# Altium integrated library GPDSE.IntLib: 634 symbols (part 4 of 7)
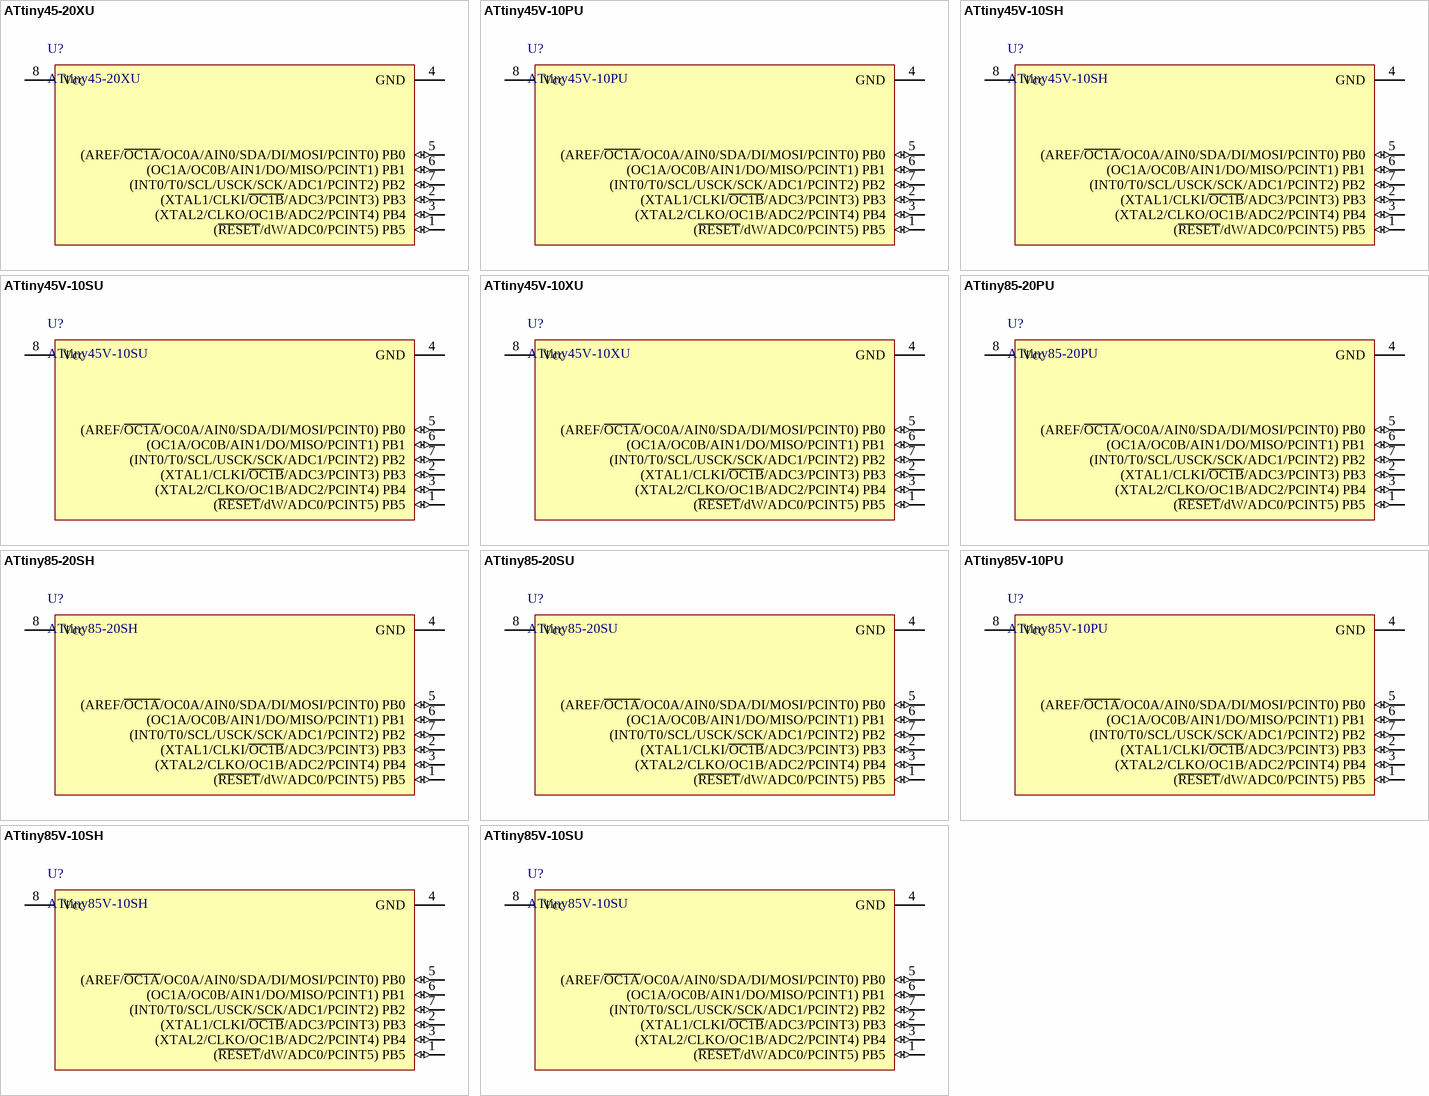
[diagram p38: symbols ATtiny45-20XU to ATtiny85V-10SU]

## ATtiny85-20SH
designator U?
Atmel 8-bit AVR Microcontroller with 8 KB In-System Programmable Flash; ADC Channel: 4; Clock Frequency: 0 - 20 MHz; Debug: debugWire; EEPROM Memory: 512 B; Flash Memory: 8 KB; I/O Pins: 6; PWM Channel: 2; Serial USI: 1; Supply Voltage (Vdd): 2.7 - 5.5 V; Analog Comparator: *; SRAM Memory: 512 B; Timer 8 bits: 1
footprint SOP08-5.3mm(1.27mm) (Small Outline Package 8 pin)
pins: 1 (~{RESET}/dW/ADC0/PCINT5) PB5 (io), 2 (XTAL1/CLKI/~{OC1B}/ADC3/PCINT3) PB3 (io), 3 (XTAL2/CLKO/OC1B/ADC2/PCINT4) PB4 (io), 4 GND (power), 5 (AREF/~{OC1A}/OC0A/AIN0/SDA/DI/MOSI/PCINT0) PB0 (io), 6 (OC1A/OC0B/AIN1/DO/MISO/PCINT1) PB1 (io), 7 (INT0/T0/SCL/USCK/SCK/ADC1/PCINT2) PB2 (io), 8 Vcc (power)

## ATtiny85-20SU
designator U?
Atmel 8-bit AVR Microcontroller with 8 KB In-System Programmable Flash; ADC Channel: 4; Clock Frequency: 0 - 20 MHz; Debug: debugWire; EEPROM Memory: 512 B; Flash Memory: 8 KB; I/O Pins: 6; PWM Channel: 2; Serial USI: 1; Supply Voltage (Vdd): 2.7 - 5.5 V; Analog Comparator: *; SRAM Memory: 512 B; Timer 8 bits: 1
footprint SOP08-5.3mm(1.27mm) (Small Outline Package 8 pin)
pins: 1 (~{RESET}/dW/ADC0/PCINT5) PB5 (io), 2 (XTAL1/CLKI/~{OC1B}/ADC3/PCINT3) PB3 (io), 3 (XTAL2/CLKO/OC1B/ADC2/PCINT4) PB4 (io), 4 GND (power), 5 (AREF/~{OC1A}/OC0A/AIN0/SDA/DI/MOSI/PCINT0) PB0 (io), 6 (OC1A/OC0B/AIN1/DO/MISO/PCINT1) PB1 (io), 7 (INT0/T0/SCL/USCK/SCK/ADC1/PCINT2) PB2 (io), 8 Vcc (power)

## ATtiny85V-10PU
designator U?
Atmel 8-bit AVR Microcontroller with 8 KB In-System Programmable Flash; ADC Channel: 4; Clock Frequency: 0 - 10 MHz; Debug: debugWire; EEPROM Memory: 512 B; Flash Memory: 8 KB; I/O Pins: 6; PWM Channel: 2; Serial USI: 1; Supply Voltage (Vdd): 1.8 - 5.5 V; Analog Comparator: *; SRAM Memory: 512 B; Timer 8 bits: 1
footprint DIP08-300(100) (DIP; 8 Leads; Row Spacing 7.62 mm; Pitch 2.54 mm; 3D CircuitWorks)
pins: 1 (~{RESET}/dW/ADC0/PCINT5) PB5 (io), 2 (XTAL1/CLKI/~{OC1B}/ADC3/PCINT3) PB3 (io), 3 (XTAL2/CLKO/OC1B/ADC2/PCINT4) PB4 (io), 4 GND (power), 5 (AREF/~{OC1A}/OC0A/AIN0/SDA/DI/MOSI/PCINT0) PB0 (io), 6 (OC1A/OC0B/AIN1/DO/MISO/PCINT1) PB1 (io), 7 (INT0/T0/SCL/USCK/SCK/ADC1/PCINT2) PB2 (io), 8 Vcc (power)

## ATtiny85V-10SH
designator U?
Atmel 8-bit AVR Microcontroller with 8 KB In-System Programmable Flash; ADC Channel: 4; Clock Frequency: 0 - 10 MHz; Debug: debugWire; EEPROM Memory: 512 B; Flash Memory: 8 KB; I/O Pins: 6; PWM Channel: 2; Serial USI: 1; Supply Voltage (Vdd): 1.8 - 5.5 V; Analog Comparator: *; SRAM Memory: 512 B; Timer 8 bits: 1
footprint SOP08-5.3mm(1.27mm) (Small Outline Package 8 pin)
pins: 1 (~{RESET}/dW/ADC0/PCINT5) PB5 (io), 2 (XTAL1/CLKI/~{OC1B}/ADC3/PCINT3) PB3 (io), 3 (XTAL2/CLKO/OC1B/ADC2/PCINT4) PB4 (io), 4 GND (power), 5 (AREF/~{OC1A}/OC0A/AIN0/SDA/DI/MOSI/PCINT0) PB0 (io), 6 (OC1A/OC0B/AIN1/DO/MISO/PCINT1) PB1 (io), 7 (INT0/T0/SCL/USCK/SCK/ADC1/PCINT2) PB2 (io), 8 Vcc (power)

## ATtiny85V-10SU
designator U?
Atmel 8-bit AVR Microcontroller with 8 KB In-System Programmable Flash; ADC Channel: 4; Clock Frequency: 0 - 10 MHz; Debug: debugWire; EEPROM Memory: 512 B; Flash Memory: 8 KB; I/O Pins: 6; PWM Channel: 2; Serial USI: 1; Supply Voltage (Vdd): 1.8 - 5.5 V; Analog Comparator: *; SRAM Memory: 512 B; Timer 8 bits: 1
footprint SOP08-5.3mm(1.27mm) (Small Outline Package 8 pin)
pins: 1 (~{RESET}/dW/ADC0/PCINT5) PB5 (io), 2 (XTAL1/CLKI/~{OC1B}/ADC3/PCINT3) PB3 (io), 3 (XTAL2/CLKO/OC1B/ADC2/PCINT4) PB4 (io), 4 GND (power), 5 (AREF/~{OC1A}/OC0A/AIN0/SDA/DI/MOSI/PCINT0) PB0 (io), 6 (OC1A/OC0B/AIN1/DO/MISO/PCINT1) PB1 (io), 7 (INT0/T0/SCL/USCK/SCK/ADC1/PCINT2) PB2 (io), 8 Vcc (power)


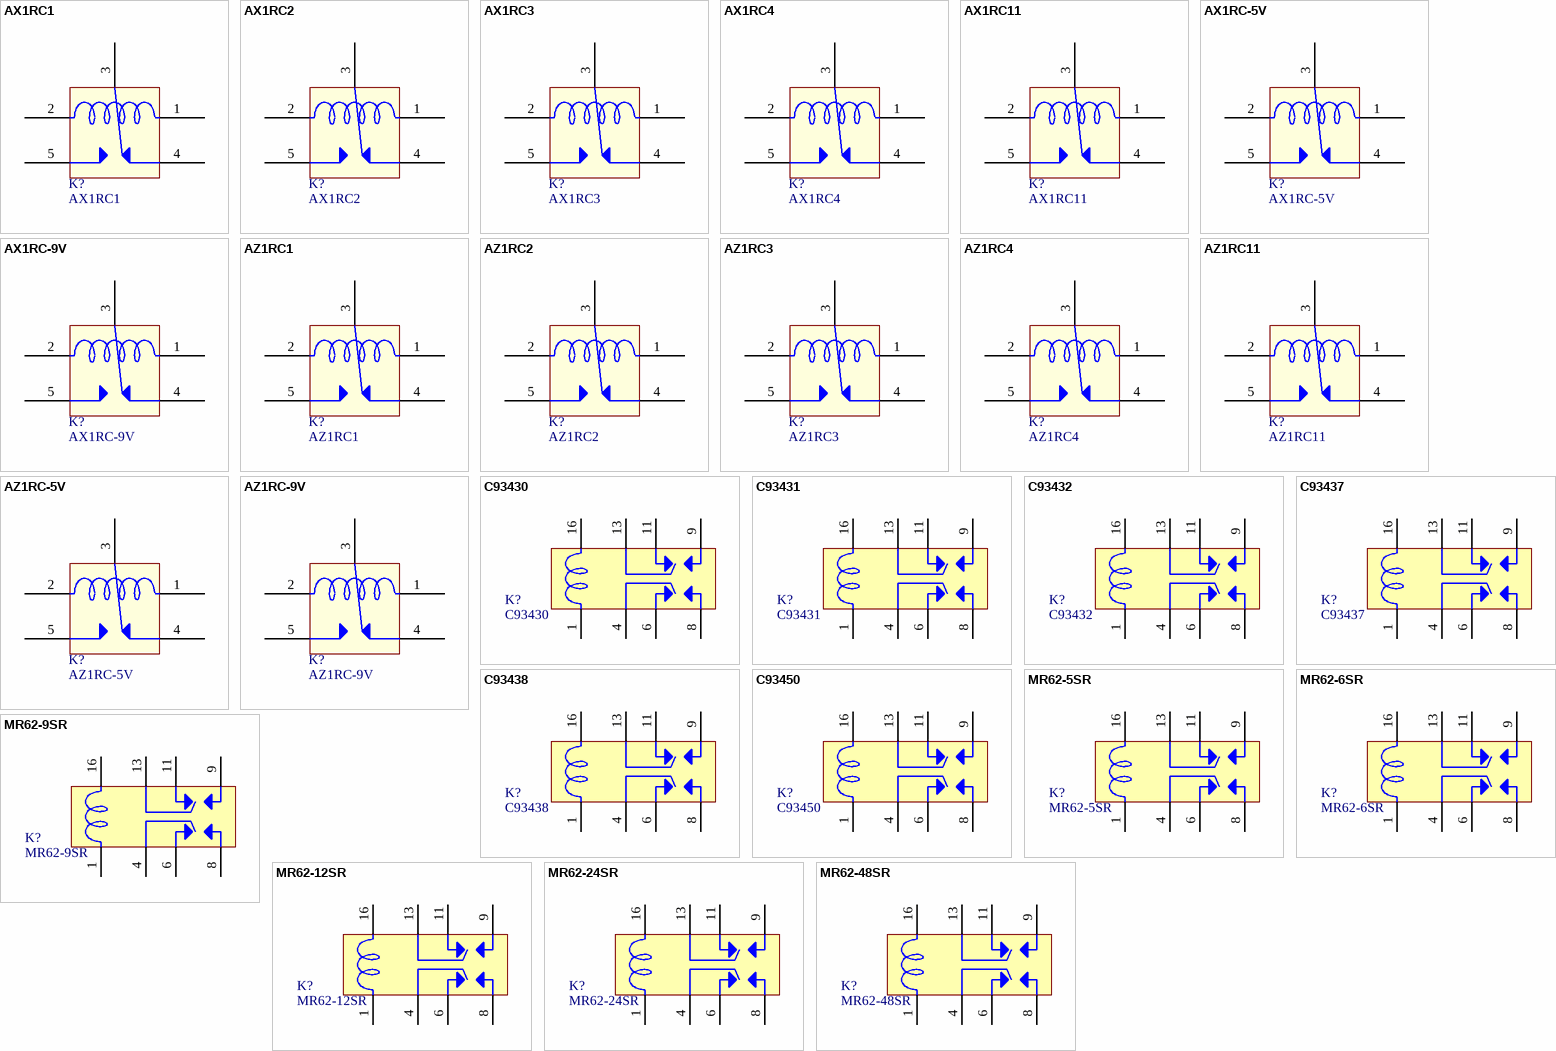
[diagram p18: symbols AX1RC1 to MR62-48SR]

## AX1RC1
designator K?
Miniature Relay, 15 A, 6 Vdc, 250 Vac; Maximum Switching Voltage (AC): 250 V; Maximum Switching Voltage (DC): 110 V; Maximum Switching Current: 15 A; Coil Nominal Voltage (DC): 6 V
footprint Relay-A (Metaltex Relay Type A; 3D: Jean-François Garneau)
pins: 1, 2, 3, 4, 5

## AX1RC2
designator K?
Miniature Relay, 15 A, 12 Vdc, 250 Vac; Maximum Switching Voltage (AC): 250 V; Maximum Switching Voltage (DC): 110 V; Maximum Switching Current: 15 A; Coil Nominal Voltage (DC): 12 V
footprint Relay-A (Metaltex Relay Type A; 3D: Jean-François Garneau)
pins: 1, 2, 3, 4, 5

## AX1RC3
designator K?
Miniature Relay, 15 A, 24 Vdc, 250 Vac; Maximum Switching Voltage (AC): 250 V; Maximum Switching Voltage (DC): 110 V; Maximum Switching Current: 15 A; Coil Nominal Voltage (DC): 24 V
footprint Relay-A (Metaltex Relay Type A; 3D: Jean-François Garneau)
pins: 1, 2, 3, 4, 5

## AX1RC4
designator K?
Miniature Relay, 15 A, 48 Vdc, 250 Vac; Maximum Switching Voltage (AC): 250 V; Maximum Switching Voltage (DC): 110 V; Maximum Switching Current: 15 A; Coil Nominal Voltage (DC): 48 V
footprint Relay-A (Metaltex Relay Type A; 3D: Jean-François Garneau)
pins: 1, 2, 3, 4, 5

## AX1RC11
designator K?
Miniature Relay, 15 A, 3 Vdc, 250 Vac; Maximum Switching Voltage (AC): 250 V; Maximum Switching Voltage (DC): 110 V; Maximum Switching Current: 15 A; Coil Nominal Voltage (DC): 3 V
footprint Relay-A (Metaltex Relay Type A; 3D: Jean-François Garneau)
pins: 1, 2, 3, 4, 5

## AX1RC-5V
designator K?
Miniature Relay, 15 A, 5 Vdc, 250 Vac; Maximum Switching Voltage (AC): 250 V; Maximum Switching Voltage (DC): 110 V; Maximum Switching Current: 15 A; Coil Nominal Voltage (DC): 5 V
footprint Relay-A (Metaltex Relay Type A; 3D: Jean-François Garneau)
pins: 1, 2, 3, 4, 5

## AX1RC-9V
designator K?
Miniature Relay, 15 A, 9 Vdc, 250 Vac; Maximum Switching Voltage (AC): 250 V; Maximum Switching Voltage (DC): 110 V; Maximum Switching Current: 15 A; Coil Nominal Voltage (DC): 9 V
footprint Relay-A (Metaltex Relay Type A; 3D: Jean-François Garneau)
pins: 1, 2, 3, 4, 5

## AZ1RC1
designator K?
Miniature Relay, 10 A, 6 Vdc, 250 Vac; Maximum Switching Voltage (AC): 250 V; Maximum Switching Voltage (DC): 30 V; Maximum Switching Current: 10 A; Coil Nominal Voltage (DC): 6 V
footprint Relay-A (Metaltex Relay Type A; 3D: Jean-François Garneau)
pins: 1, 2, 3, 4, 5

## AZ1RC2
designator K?
Miniature Relay, 10 A, 12 Vdc, 250 Vac; Maximum Switching Voltage (AC): 250 V; Maximum Switching Voltage (DC): 30 V; Maximum Switching Current: 10 A; Coil Nominal Voltage (DC): 12 V
footprint Relay-A (Metaltex Relay Type A; 3D: Jean-François Garneau)
pins: 1, 2, 3, 4, 5

## AZ1RC3
designator K?
Miniature Relay, 10 A, 24 Vdc, 250 Vac; Maximum Switching Voltage (AC): 250 V; Maximum Switching Voltage (DC): 30 V; Maximum Switching Current: 10 A; Coil Nominal Voltage (DC): 24 V
footprint Relay-A (Metaltex Relay Type A; 3D: Jean-François Garneau)
pins: 1, 2, 3, 4, 5

## AZ1RC4
designator K?
Miniature Relay, 10 A, 48 Vdc, 250 Vac; Maximum Switching Voltage (AC): 250 V; Maximum Switching Voltage (DC): 30 V; Maximum Switching Current: 10 A; Coil Nominal Voltage (DC): 48 V
footprint Relay-A (Metaltex Relay Type A; 3D: Jean-François Garneau)
pins: 1, 2, 3, 4, 5

## AZ1RC11
designator K?
Miniature Relay, 10 A, 3 Vdc, 250 Vac; Maximum Switching Voltage (AC): 250 V; Maximum Switching Voltage (DC): 30 V; Maximum Switching Current: 10 A; Coil Nominal Voltage (DC): 3 V
footprint Relay-A (Metaltex Relay Type A; 3D: Jean-François Garneau)
pins: 1, 2, 3, 4, 5

## AZ1RC-5V
designator K?
Miniature Relay, 10 A, 5 Vdc, 250 Vac; Maximum Switching Voltage (AC): 250 V; Maximum Switching Voltage (DC): 30 V; Maximum Switching Current: 10 A; Coil Nominal Voltage (DC): 5 V
footprint Relay-A (Metaltex Relay Type A; 3D: Jean-François Garneau)
pins: 1, 2, 3, 4, 5

## AZ1RC-9V
designator K?
Miniature Relay, 10 A, 9 Vdc, 250 Vac; Maximum Switching Voltage (AC): 250 V; Maximum Switching Voltage (DC): 30 V; Maximum Switching Current: 10 A; Coil Nominal Voltage (DC): 9 V
footprint Relay-A (Metaltex Relay Type A; 3D: Jean-François Garneau)
pins: 1, 2, 3, 4, 5

## C93430
designator K?
Signal Relay, 2 A, 48 Vdc, 250 Vac; Maximum Switching Voltage (AC): 250 V; Maximum Switching Voltage (DC): 220 V; Maximum Switching Current: 2 A; Coil Nominal Voltage (DC): 48 V
footprint RELAY-ML (Metaltex Relay Type ML; 3D: Andrea Gramazio)
pins: 1 Coil1, 4 C1, 6 NC1, 8 NO1, 9 NO2, 11 NC2, 13 C2, 16 Coil2

## C93431
designator K?
Signal Relay, 2 A, 24 Vdc, 250 Vac; Maximum Switching Voltage (AC): 250 V; Maximum Switching Voltage (DC): 220 V; Maximum Switching Current: 2 A; Coil Nominal Voltage (DC): 24 V
footprint RELAY-ML (Metaltex Relay Type ML; 3D: Andrea Gramazio)
pins: 1 Coil1, 4 C1, 6 NC1, 8 NO1, 9 NO2, 11 NC2, 13 C2, 16 Coil2

## C93432
designator K?
Signal Relay, 2 A, 12 Vdc, 250 Vac; Maximum Switching Voltage (AC): 250 V; Maximum Switching Voltage (DC): 220 V; Maximum Switching Current: 2 A; Coil Nominal Voltage (DC): 12 V
footprint RELAY-ML (Metaltex Relay Type ML; 3D: Andrea Gramazio)
pins: 1 Coil1, 4 C1, 6 NC1, 8 NO1, 9 NO2, 11 NC2, 13 C2, 16 Coil2

## C93437
designator K?
Signal Relay, 2 A, 6 Vdc, 250 Vac; Maximum Switching Voltage (AC): 250 V; Maximum Switching Voltage (DC): 220 V; Maximum Switching Current: 2 A; Coil Nominal Voltage (DC): 6 V
footprint RELAY-ML (Metaltex Relay Type ML; 3D: Andrea Gramazio)
pins: 1 Coil1, 4 C1, 6 NC1, 8 NO1, 9 NO2, 11 NC2, 13 C2, 16 Coil2

## C93438
designator K?
Signal Relay, 2 A, 4.5 Vdc, 250 Vac; Maximum Switching Voltage (AC): 250 V; Maximum Switching Voltage (DC): 220 V; Maximum Switching Current: 2 A; Coil Nominal Voltage (DC): 4.5 V
footprint RELAY-ML (Metaltex Relay Type ML; 3D: Andrea Gramazio)
pins: 1 Coil1, 4 C1, 6 NC1, 8 NO1, 9 NO2, 11 NC2, 13 C2, 16 Coil2

## C93450
designator K?
Signal Relay, 2 A, 5 Vdc, 250 Vac; Maximum Switching Voltage (AC): 250 V; Maximum Switching Voltage (DC): 220 V; Maximum Switching Current: 2 A; Coil Nominal Voltage (DC): 5 V
footprint RELAY-ML (Metaltex Relay Type ML; 3D: Andrea Gramazio)
pins: 1 Coil1, 4 C1, 6 NC1, 8 NO1, 9 NO2, 11 NC2, 13 C2, 16 Coil2

## MR62-5SR
designator K?
Miniature Signal Relay, 2 A, 5 Vdc, 250 Vac; Maximum Switching Voltage (AC): 250 V; Maximum Switching Voltage (DC): 220 V; Maximum Switching Current: 2 A; Coil Nominal Voltage (DC): 5 V
footprint RELAY-ML (Metaltex Relay Type ML; 3D: Andrea Gramazio)
pins: 1 Coil1, 4 C1, 6 NC1, 8 NO1, 9 NO2, 11 NC2, 13 C2, 16 Coil2

## MR62-6SR
designator K?
Miniature Signal Relay, 2 A, 6 Vdc, 250 Vac; Maximum Switching Voltage (AC): 250 V; Maximum Switching Voltage (DC): 220 V; Maximum Switching Current: 2 A; Coil Nominal Voltage (DC): 6 V
footprint RELAY-ML (Metaltex Relay Type ML; 3D: Andrea Gramazio)
pins: 1 Coil1, 4 C1, 6 NC1, 8 NO1, 9 NO2, 11 NC2, 13 C2, 16 Coil2

## MR62-9SR
designator K?
Miniature Signal Relay, 2 A, 9 Vdc, 250 Vac; Maximum Switching Voltage (AC): 250 V; Maximum Switching Voltage (DC): 220 V; Maximum Switching Current: 2 A; Coil Nominal Voltage (DC): 9 V
footprint RELAY-ML (Metaltex Relay Type ML; 3D: Andrea Gramazio)
pins: 1 Coil1, 4 C1, 6 NC1, 8 NO1, 9 NO2, 11 NC2, 13 C2, 16 Coil2

## MR62-12SR
designator K?
Miniature Signal Relay, 2 A, 12 Vdc, 250 Vac; Maximum Switching Voltage (AC): 250 V; Maximum Switching Voltage (DC): 220 V; Maximum Switching Current: 2 A; Coil Nominal Voltage (DC): 12 V
footprint RELAY-ML (Metaltex Relay Type ML; 3D: Andrea Gramazio)
pins: 1 Coil1, 4 C1, 6 NC1, 8 NO1, 9 NO2, 11 NC2, 13 C2, 16 Coil2

## MR62-24SR
designator K?
Miniature Signal Relay, 2 A, 24 Vdc, 250 Vac; Maximum Switching Voltage (AC): 250 V; Maximum Switching Voltage (DC): 220 V; Maximum Switching Current: 2 A; Coil Nominal Voltage (DC): 24 V
footprint RELAY-ML (Metaltex Relay Type ML; 3D: Andrea Gramazio)
pins: 1 Coil1, 4 C1, 6 NC1, 8 NO1, 9 NO2, 11 NC2, 13 C2, 16 Coil2

## MR62-48SR
designator K?
Miniature Signal Relay, 2 A, 48 Vdc, 250 Vac; Maximum Switching Voltage (AC): 250 V; Maximum Switching Voltage (DC): 220 V; Maximum Switching Current: 2 A; Coil Nominal Voltage (DC): 48 V
footprint RELAY-ML (Metaltex Relay Type ML; 3D: Andrea Gramazio)
pins: 1 Coil1, 4 C1, 6 NC1, 8 NO1, 9 NO2, 11 NC2, 13 C2, 16 Coil2


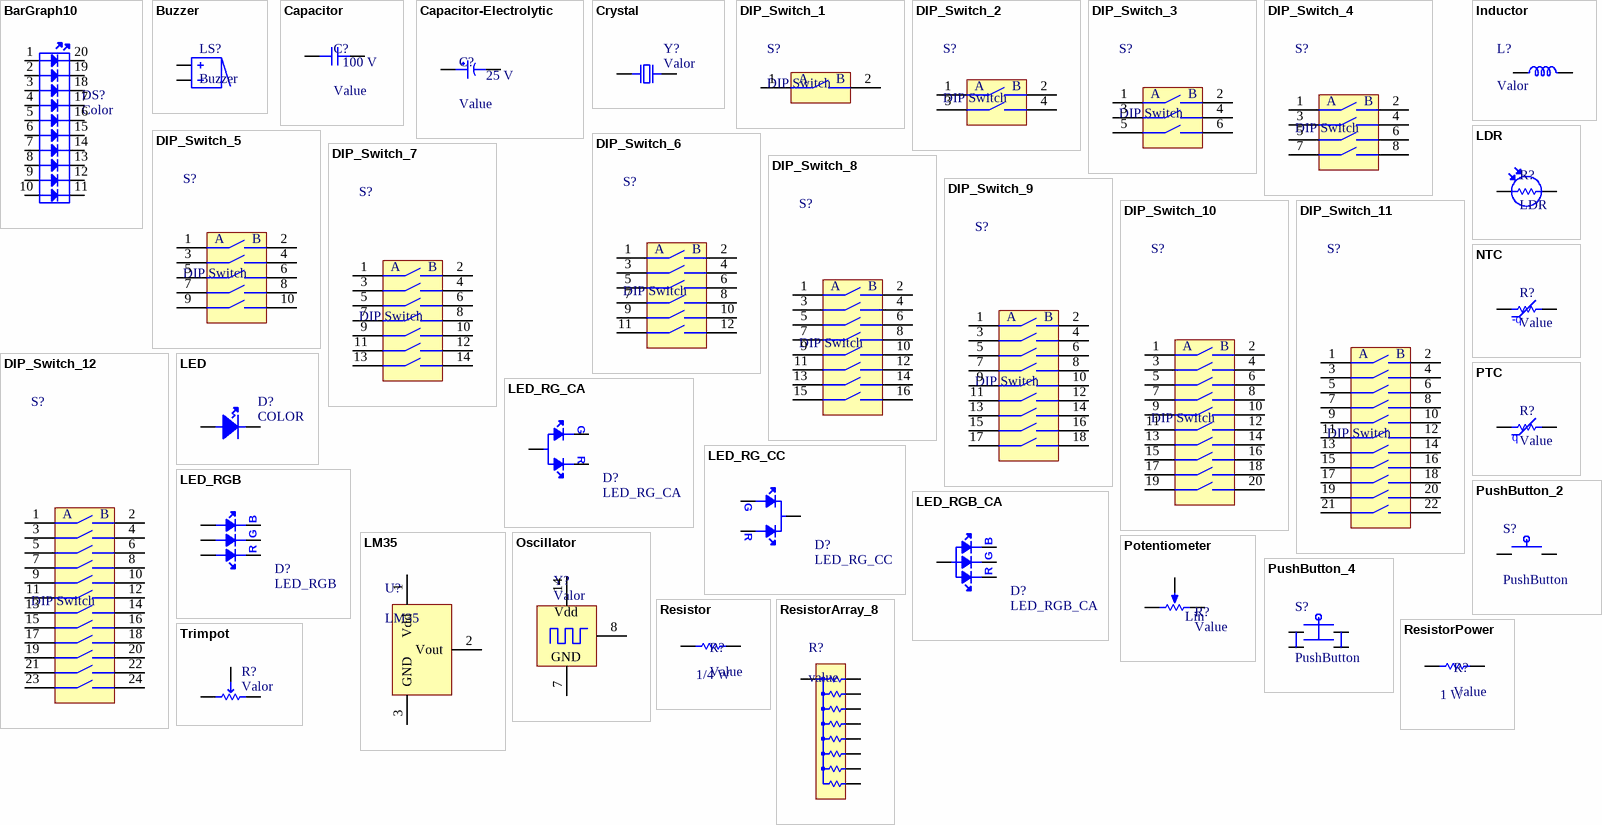
[diagram p19: symbols BarGraph10 to Trimpot]

## BarGraph10
designator DS?, comment Color
10 Segments - Bar Graph
footprint B210G (10 Segments Bar Graph - Yellow Green)
footprint B210O (10 Segments Bar Graph - Red Orange)
footprint B210SR (10 Segments Bar Graph - Ultra Bright Red)
footprint B210B-14BL (10 Segments Bar Graph - Ultra Bright Blue)
pins: 1 A1, 2 A2, 3 A3, 4 A4, 5 A5, 6 A6, 7 A7, 8 A8, 9 A9, 10 A10, 11 K10, 12 K9, 13 K8, 14 K7, 15 K6, 16 K5, 17 K4, 18 K3, 19 K2, 20 K1

## Buzzer
designator LS?
footprint Buzzer-12.0mm-6.5mm (Buzzer circular 12.0mm diameter 6.5mm pitch)
pins: 1 -, 2 +

## Capacitor
designator C?, comment Value  Voltage: 100 V
Capacitor; Published: 8-Jun-2000; LatestRevisionDate: 17-Jul-2002; LatestRevisionNote: Re-released for DXP Platform.; PackageReference: RAD-0.3; Publisher: Altium Limited
footprint C100-200-100 (Radial Cap, Thru-Hole; 2 Leads; 0.1 in Pin Spacing)
footprint C200-350-150 (Radial Cap, Thru-Hole; 2 Leads; 0.2 in Pin Spacing)
footprint C300-450-150 (Radial Cap, Thru-Hole; 2 Leads; 0.3 in Pin Spacing)
footprint C400-550-150 (Radial Cap, Thru-Hole; 2 Leads; 0.4 in Pin Spacing)
footprint 0805C (Chip Capacitor; Body 2 x 1.3 mm (LxW typ))
pins: 1, 2

## Capacitor-Electrolytic
designator C?, comment Value  Voltage: 25 V
Electrolytic Capacitor
footprint CP-RAD-4.0mm-7.0mm-1.5mm (Radial Capacitor; D 4.0mm; L 7.0mm; P 1.5mm)
footprint CP-RAD-4.0mm-11.0mm-1.5mm (Radial Capacitor; D 4.0mm; L 11.0mm; P 1.5mm)
footprint CP-RAD-5.0mm-7.0mm-2.0mm (Radial Capacitor; D 5.0mm; L 7.0mm; P 2.0mm)
footprint CP-RAD-5.0mm-11.0mm-2.0mm (Radial Capacitor; D 5.0mm; L 11.0mm; P 2.0mm)
footprint CP-RAD-5.0mm-15.0mm-2.0mm (Radial Capacitor; D 5.0mm; L 15.0mm; P 2.0mm)
footprint CP-RAD-6.3mm-7.0mm-2.5mm (Radial Capacitor; D 6.3mm; L 7.0mm; P 2.5mm)
footprint CP-RAD-6.3mm-11.2mm-2.5mm (Radial Capacitor; D 6.3mm; L 11.2mm; P 2.5mm)
footprint CP-RAD-6.3mm-15.0mm-2.5mm (Radial Capacitor; D 6.3mm; L 15.0mm; P 2.5mm)
footprint CP-RAD-8.0mm-11.5mm-3.5mm (Radial Capacitor; D 8.0mm; L 11.5mm; P 3.5mm)
footprint CP-RAD-8.0mm-15.0mm-3.5mm (Radial Capacitor; D 8.0mm; L 15.0mm; P 3.5mm)
footprint CP-RAD-8.0mm-20.0mm-3.5mm (Radial Capacitor; D 8.0mm; L 20.0mm; P 3.5mm)
footprint CP-RAD-10.0mm-12.5mm-5.0mm (Radial Capacitor; D 10.0mm; L 12.5mm; P 5.0mm)
footprint CP-RAD-10.0mm-16.0mm-5.0mm (Radial Capacitor; D 10.0mm; L 16.0mm; P 5.0mm)
footprint CP-RAD-10.0mm-20.0mm-5.0mm (Radial Capacitor; D 10.0mm; L 20.0mm; P 5.0mm)
footprint CP-RAD-10.0mm-25.0mm-5.0mm (Radial Capacitor; D 10.0mm; L 25.0mm; P 5.0mm)
footprint CP-RAD-10.0mm-30.0mm-5.0mm (Radial Capacitor; D 10.0mm; L 30.0mm; P 5.0mm)
footprint CP-RAD-12.5mm-15.0mm-5.0mm (Radial Capacitor; D 12.5mm; L 15.0mm; P 5.0mm)
footprint CP-RAD-12.5mm-20.0mm-5.0mm (Radial Capacitor; D 12.5mm; L 20.0mm; P 5.0mm)
footprint CP-RAD-12.5mm-25.0mm-5.0mm (Radial Capacitor; D 12.5mm; L 25.0mm; P 5.0mm)
footprint CP-RAD-12.5mm-30.0mm-5.0mm (Radial Capacitor; D 12.5mm; L 30.0mm; P 5.0mm)
footprint CP-RAD-12.5mm-40.0mm-5.0mm (Radial Capacitor; D 12.5mm; L 40.0mm; P 5.0mm)
footprint CP-RAD-16.0mm-15.0mm-7.5mm (Radial Capacitor; D 16.0mm; L 15.0mm; P 7.5mm)
footprint CP-RAD-16.0mm-20.0mm-7.5mm (Radial Capacitor; D 16.0mm; L 20.0mm; P 7.5mm)
footprint CP-RAD-16.0mm-25.0mm-7.5mm (Radial Capacitor; D 16.0mm; L 25.0mm; P 7.5mm)
footprint CP-RAD-16.0mm-31.5mm-7.5mm (Radial Capacitor; D 16.0mm; L 31.5mm; P 7.5mm)
footprint CP-RAD-16.0mm-35.5mm-7.5mm (Radial Capacitor; D 16.0mm; L 35.5mm; P 7.5mm)
footprint CP-RAD-16.0mm-40.0mm-7.5mm (Radial Capacitor; D 16.0mm; L 40.0mm; P 7.5mm)
footprint CP-RAD-18.0mm-15.0mm-7.5mm (Radial Capacitor; D 18.0mm; L 15.0mm; P 7.5mm)
footprint CP-RAD-18.0mm-20.0mm-7.5mm (Radial Capacitor; D 18.0mm; L 20.0mm; P 7.5mm)
footprint CP-RAD-18.0mm-25.0mm-7.5mm (Radial Capacitor; D 18.0mm; L 25.0mm; P 7.5mm)
footprint CP-RAD-18.0mm-31.5mm-7.5mm (Radial Capacitor; D 18.0mm; L 31.5mm; P 7.5mm)
footprint CP-RAD-18.0mm-35.5mm-7.5mm (Radial Capacitor; D 18.0mm; L 35.5mm; P 7.5mm)
footprint CP-RAD-18.0mm-40.0mm-7.5mm (Radial Capacitor; D 18.0mm; L 40.0mm; P 7.5mm)
footprint CP-RAD-12.5mm-35.0mm-5.0mm (Radial Capacitor; D 12.5mm; L 35.0mm; P 5.0mm)
footprint CP-SMD(B)-4.3mm-4.3mm-5.4mm (Electrolytic Capacitor SMD Radial Can; C Type; W 4.3mm; L 4.3mm; H 5.4mm)
footprint CP-SMD(C)-5.3mm-5.3mm-5.8mm (Electrolytic Capacitor SMD Radial Can; C Type; W 5.3mm; L 5.3mm; H 5.8mm)
footprint CP-SMD(D)-6.6mm-6.6mm-5.8mm (Electrolytic Capacitor SMD Radial Can; D Type; W 6.6mm; L 6.6mm; H 5.8mm)
footprint CP-SMD(D8)-6.6mm-6.6mm-7.7mm (Electrolytic Capacitor SMD Radial Can; D8 Type; W 6.6mm; L 6.6mm; H 7.7mm)
footprint CP-SMD(E)-8.3mm-8.3mm-6.2mm (Electrolytic Capacitor SMD Radial Can; F Type; W 8.3mm; L 8.3mm; H 6.2mm)
footprint CP-SMD(F)-8.3mm-8.3mm-10.2mm (Electrolytic Capacitor SMD Radial Can; F Type; W 8.3mm; L 8.3mm; H 10.2mm)
footprint CP-SMD(G)-10.3mm-10.3mm-10.2mm (Electrolytic Capacitor SMD Radial Can; G Type; W 10.3mm; L 10.3mm; H 10.2mm)
footprint CP-SMD(G13)-10.3mm-10.3mm-13.5mm (Electrolytic Capacitor SMD Radial Can; G13 Type; W 10.3mm; L 10.3mm; H 13.5mm)
footprint CP-SMD(G17)-10.3mm-10.3mm-16.5mm (Electrolytic Capacitor SMD Radial Can; G17 Type; W 10.3mm; L 10.3mm; H 16.5mm)
footprint CP-SMD(H13)-13.5mm-13.5mm-13.5mm (Electrolytic Capacitor SMD Radial Can; H13 Type; W 13.5mm; L 13.5mm; H 13.5mm)
footprint CP-SMD(H16)-13.5mm-13.5mm-16.5mm (Electrolytic Capacitor SMD Radial Can; H16 Type; W 13.5mm; L 13.5mm; H 16.5mm)
footprint CP-SMD(J16)-17.0mm-17.0mm-16.5mm (Electrolytic Capacitor SMD Radial Can; J16 Type; W 17.0mm; L 17.0mm; H 16.5mm)
footprint CP-SMD(J21)-17.0mm-17.0mm-21.5mm (Electrolytic Capacitor SMD Radial Can; J21 Type; W 17.0mm; L 17.0mm; H 21.5mm)
footprint CP-SMD(K16)-19.0mm-19.0mm-16.5mm (Electrolytic Capacitor SMD Radial Can; K16 Type; W 19.0mm; L 19.0mm; H 16.5mm)
footprint CP-SMD(K21)-19.0mm-19.0mm-21.5mm (Electrolytic Capacitor SMD Radial Can; K21 Type; W 19.0mm; L 19.0mm; H 21.5mm)
pins: 1, 2
1 alternate drawing of the same symbol

## Crystal
designator Y?, comment Valor
Crystal
footprint Crystal-3.0mm-8.0mm (THT Quartz Crystal Metal Can 3mm diameter 8mm large)
footprint Crystal-3.0mm-8.0mm-H (THT Quartz Crystal Metal Can 3mm diameter 8mm large Horizontal Mount)
footprint HC49-US-SMD (SMD Quartz Crystal)
footprint HC49-US-THT (THT Quartz Crystal)
pins: 1, 2

## DIP_Switch_1
designator S?, comment DIP Switch
DIP SWITCH 1 switch
footprint DS01-300(100)-180 (Dip-Switch 1 element 180 degress)
pins: 1 1A, 2 1B
text: A; B

## DIP_Switch_2
designator S?, comment DIP Switch
DIP SWITCH 2 switches
footprint DS02-300(100)-180 (Dip-Switch 2 elements 180 degress)
pins: 1 1A, 2 1B, 3 2A, 4 2B
text: A; B

## DIP_Switch_3
designator S?, comment DIP Switch
DIP SWITCH 3 switches
footprint DS03-300(100)-180 (Dip-Switch 3 elements 180 degress)
pins: 1 1A, 2 1B, 3 2A, 4 2B, 5 3A, 6 3B
text: A; B

## DIP_Switch_4
designator S?, comment DIP Switch
DIP SWITCH 4 switches
footprint DS04-300(100)-180 (Dip-Switch 4 elements 180 degress)
pins: 1 1A, 2 1B, 3 2A, 4 2B, 5 3A, 6 3B, 7 4A, 8 4B
text: A; B

## DIP_Switch_5
designator S?, comment DIP Switch
DIP SWITCH 5 switches
footprint DS05-300(100)-180 (Dip-Switch 5 elements 180 degress)
pins: 1 1A, 2 1B, 3 2A, 4 2B, 5 3A, 6 3B, 7 4A, 8 4B, 9 5A, 10 5B
text: A; B

## DIP_Switch_6
designator S?, comment DIP Switch
DIP SWITCH 6 switches
footprint DS06-300(100)-180 (Dip-Switch 6 elements 180 degress)
pins: 1 1A, 2 1B, 3 2A, 4 2B, 5 3A, 6 3B, 7 4A, 8 4B, 9 5A, 10 5B, 11 6A, 12 6B
text: A; B

## DIP_Switch_7
designator S?, comment DIP Switch
DIP SWITCH 7 switches
footprint DS07-300(100)-180 (Dip-Switch 7 elements 180 degress)
pins: 1 1A, 2 1B, 3 2A, 4 2B, 5 3A, 6 3B, 7 4A, 8 4B, 9 5A, 10 5B, 11 6A, 12 6B, 13 7A, 14 7B
text: A; B

## DIP_Switch_8
designator S?, comment DIP Switch
DIP SWITCH 8 switches
footprint DS08-300(100)-180 (Dip-Switch 8 elements 180 degress)
pins: 1 1A, 2 1B, 3 2A, 4 2B, 5 3A, 6 3B, 7 4A, 8 4B, 9 5A, 10 5B, 11 6A, 12 6B, 13 7A, 14 7B, 15 8A, 16 8B
text: A; B

## DIP_Switch_9
designator S?, comment DIP Switch
DIP SWITCH 9 switches
footprint DS09-300(100)-180 (Dip-Switch 9 elements 180 degress)
pins: 1 1A, 2 1B, 3 2A, 4 2B, 5 3A, 6 3B, 7 4A, 8 4B, 9 5A, 10 5B, 11 6A, 12 6B, 13 7A, 14 7B, 15 8A, 16 8B, 17 9A, 18 9B
text: A; B

## DIP_Switch_10
designator S?, comment DIP Switch
DIP SWITCH 10 switches
footprint DS10-300(100)-180 (Dip-Switch 10 elements 180 degress)
pins: 1 1A, 2 1B, 3 2A, 4 2B, 5 3A, 6 3B, 7 4A, 8 4B, 9 5A, 10 5B, 11 6A, 12 6B, 13 7A, 14 7B, 15 8A, 16 8B, 17 9A, 18 9B, 19 10A, 20 10B
text: A; B

## DIP_Switch_11
designator S?, comment DIP Switch
DIP SWITCH 11 switches
footprint DS11-300(100)-180 (Dip-Switch 11 elements 180 degress)
pins: 1 1A, 2 1B, 3 2A, 4 2B, 5 3A, 6 3B, 7 4A, 8 4B, 9 5A, 10 5B, 11 6A, 12 6B, 13 7A, 14 7B, 15 8A, 16 8B, 17 9A, 18 9B, 19 10A, 20 10B, 21 11A, 22 11B
text: A; B

## DIP_Switch_12
designator S?, comment DIP Switch
DIP SWITCH 12 switches
footprint DS12-300(100)-180 (Dip-Switch 12 elements 180 degress)
pins: 1 1A, 2 1B, 3 2A, 4 2B, 5 3A, 6 3B, 7 4A, 8 4B, 9 5A, 10 5B, 11 6A, 12 6B, 13 7A, 14 7B, 15 8A, 16 8B, 17 9A, 18 9B, 19 10A, 20 10B, 21 11A, 22 11B, 23 12A, 24 12B
text: A; B

## Inductor
designator L?, comment Valor
Inductor
footprint L400-2.0mm (Axial Device, Thru-Hole; 2 Leads; 0.4 in Pin Spacing)
footprint 0805I (Chip Inductor; Body 2 x 1.3 mm (LxW typ))
footprint UP1B (SMD Inductor)
footprint UP2B (SMD Inductor)
footprint UP3B (SMD Inductor)
footprint UP4B (SMD Inductor)
pins: 1, 2

## LDR
designator R?
Ligh Dependant Resistor
footprint LDR-5mm (Light Dependant Resistor 5 mm)
pins: 1, 2

## LED
designator D?, comment COLOR
Light Emitting Diode
pins: A, K

## LED_RG_CA
designator D?
Led Bicolor Red-Green Common Anode
pins: A, G, R

## LED_RG_CC
designator D?
Led Bicolor Red-Green Common Cathode
pins: G, K, R

## LED_RGB
designator D?
Led Tricolor Red-Green-Blue
footprint 5050-LED-RGB
pins: BA, BC, GA, GC, RA, RC
text: B; G; R

## LED_RGB_CA
designator D?
Led Tricolor Red-Green-Blue Common Anode
pins: A, B, G, R

## LM35
designator U?
Precise Centigrade Temperature Sensor; Supply Voltage (Vdd): 4 - 30 V
footprint TO-92/123 (Transistor Outline Package, Case Style 92 123; 3D Sergey Atanov)
footprint TO-46/123 (Transistor Outline Package, Case Style 46 123; 3D)
footprint SOIC08-150(50) (SOIC 8 Leads; Row Spacing 3.81 mm; Pitch 1.27 mm; 3D André L´Hérault); pin to pad 1>8 2>1 3>4
footprint TO-220/123 (TO, Thru-Hole, Vertical, Heatsink Mounted; 3 In-Line Leads; Pitch 2.54 mm); pin to pad 2>3 3>2
pins: 1 Vdd, 2 Vout, 3 GND

## NTC
designator R?, comment Value
Negative Temperature Coefficient Thermistor
footprint Thermistor-100mil (Thermistor 100 mil)
pins: 1, 2
text: -q

## Oscillator
designator Y?, comment Valor
Oscillator
footprint Oscillator-DIP14 (THT Quartz Oscillator Metal DIP14; 3D Leszek Madej)
pins: 7 GND, 8 OUT, 14 Vdd

## Potentiometer
designator R?, comment Value  Type: Lin
Potentiometer
footprint HDR-M-1x3-2.54mm-180-9.2mm (Male Header, 1 line 3 rows, 180 degrees, 9.2 mm length)
footprint POT (Connector; Header; 3 Position)
pins: 1 TOP, 2 TAP, 3 BOT
1 alternate drawing of the same symbol
